# Altium schematic symbol library LATTICEPLDS_Library.SchLib: 291 symbols (part 3 of 32) (continued)
## LC4128ZE-TN100 (continued)
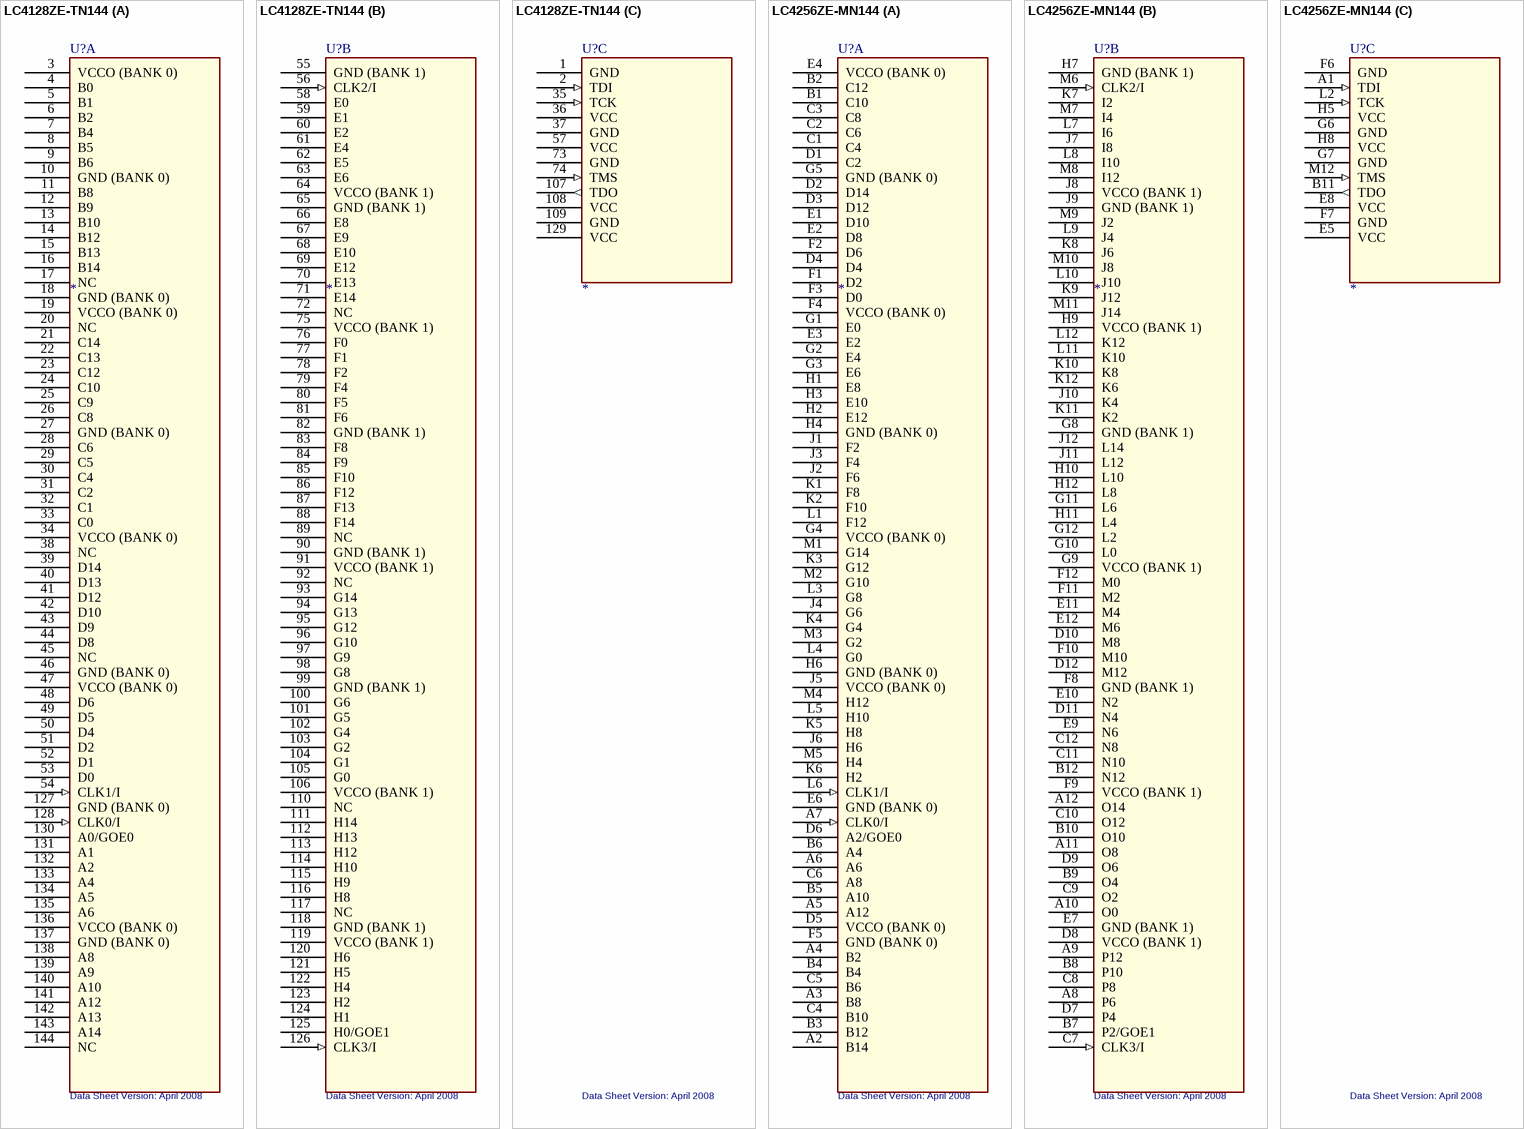
[diagram p26: symbols LC4128ZE-TN144 to LC4256ZE-MN144]

## LC4128ZE-TN144
designator U?  Data Sheet Version: April 2008
SWAP_INFO: (S1+S2+S3); SPLIT_INST: TRUE
part A pins: 3 VCCO (BANK 0) (power), 4 B0, 5 B1, 6 B2, 7 B4, 8 B5, 9 B6, 10 GND (BANK 0) (power), 11 B8, 12 B9, 13 B10, 14 B12, 15 B13, 16 B14, 17 NC, 18 GND (BANK 0) (power), 19 VCCO (BANK 0) (power), 20 NC, 21 C14, 22 C13, 23 C12, 24 C10, 25 C9, 26 C8, 27 GND (BANK 0) (power), 28 C6, 29 C5, 30 C4, 31 C2, 32 C1, 33 C0, 34 VCCO (BANK 0) (power), 38 NC, 39 D14, 40 D13, 41 D12, 42 D10, 43 D9, 44 D8, 45 NC, 46 GND (BANK 0) (power), 47 VCCO (BANK 0) (power), 48 D6, 49 D5, 50 D4, 51 D2, 52 D1, 53 D0, 54 CLK1/I (in), 127 GND (BANK 0) (power), 128 CLK0/I (in), 130 A0/GOE0, 131 A1, 132 A2, 133 A4, 134 A5, 135 A6, 136 VCCO (BANK 0) (power), 137 GND (BANK 0) (power), 138 A8, 139 A9, 140 A10, 141 A12, 142 A13, 143 A14, 144 NC
part B pins: 55 GND (BANK 1) (power), 56 CLK2/I (in), 58 E0, 59 E1, 60 E2, 61 E4, 62 E5, 63 E6, 64 VCCO (BANK 1) (power), 65 GND (BANK 1) (power), 66 E8, 67 E9, 68 E10, 69 E12, 70 E13, 71 E14, 72 NC, 75 VCCO (BANK 1) (power), 76 F0, 77 F1, 78 F2, 79 F4, 80 F5, 81 F6, 82 GND (BANK 1) (power), 83 F8, 84 F9, 85 F10, 86 F12, 87 F13, 88 F14, 89 NC, 90 GND (BANK 1) (power), 91 VCCO (BANK 1) (power), 92 NC, 93 G14, 94 G13, 95 G12, 96 G10, 97 G9, 98 G8, 99 GND (BANK 1) (power), 100 G6, 101 G5, 102 G4, 103 G2, 104 G1, 105 G0, 106 VCCO (BANK 1) (power), 110 NC, 111 H14, 112 H13, 113 H12, 114 H10, 115 H9, 116 H8, 117 NC, 118 GND (BANK 1) (power), 119 VCCO (BANK 1) (power), 120 H6, 121 H5, 122 H4, 123 H2, 124 H1, 125 H0/GOE1, 126 CLK3/I (in)
part C pins: 1 GND (power), 2 TDI (in), 35 TCK (in), 36 VCC (power), 37 GND (power), 57 VCC (power), 73 GND (power), 74 TMS (in), 107 TDO (out), 108 VCC (power), 109 GND (power), 129 VCC (power)

## LC4256ZE-MN144
designator U?  Data Sheet Version: April 2008
SWAP_INFO: (S1+S2+S3); SPLIT_INST: TRUE
part A pins: A2 B14, A3 B8, A4 B2, A5 A12, A6, A7 CLK0/I (in), B1 C10, B2 C12, B3 B12, B4, B5 A10, B6 A4, C1 C4, C2 C6, C3 C8, C4 B10, C5 B6, C6 A8, D1 C2, D2 D14, D3 D12, D4, D5 VCCO (BANK 0) (power), D6 A2/GOE0, E1 D10, E2 D8, E3 E2, E4 VCCO (BANK 0) (power), E6 GND (BANK 0) (power), F1 D2, F2 D6, F3 D0, F4 VCCO (BANK 0) (power), F5 GND (BANK 0) (power), G1 E0, G2 E4, G3 E6, G4 VCCO (BANK 0) (power), G5 GND (BANK 0) (power), H1 E8, H2 E12, H3 E10, H4 GND (BANK 0) (power), H6 GND (BANK 0) (power), J1 F2, J2 F6, J3 F4, J4 G6, J5 VCCO (BANK 0) (power), J6 H6, K1 F8, K2 F10, K3 G12, K4 G4, K5 H8, K6 H2, L1 F12, L3 G8, L4 G0, L5 H10, L6 CLK1/I (in), M1 G14, M2 G10, M3 G2, M4 H12, M5 H4
part B pins: A8 P6, A9 P12, A10 O0, A11 O8, A12 O14, B7 P2/GOE1, B8 P10, B9 O4, B10 O10, B12 N12, C7 CLK3/I (in), C8 P8, C9 O2, C10 O12, C11 N10, C12 N8, D7 P4, D8 VCCO (BANK 1) (power), D9 O6, D10 M8, D11 N4, D12 M12, E7 GND (BANK 1) (power), E9 N6, E10 N2, E11 M4, E12 M6, F8 GND (BANK 1) (power), F9 VCCO (BANK 1) (power), F10 M10, F11 M2, F12 M0, G8 GND (BANK 1) (power), G9 VCCO (BANK 1) (power), G10 L0, G11 L6, G12 L2, H7 GND (BANK 1) (power), H9 VCCO (BANK 1) (power), H10 L10, H11 L4, H12 L8, J7 I8, J8 VCCO (BANK 1) (power), J9 GND (BANK 1) (power), J10 K4, J11 L12, J12 L14, K7 I2, K8 J6, K9 J12, K10 K8, K11 K2, K12 K6, L7 I6, L8 I10, L9 J4, L10 J10, L11 K10, L12 K12, M6 CLK2/I (in), M7 I4, M8 I12, M9 J2, M10 J8, M11 J14
part C pins: A1 TDI (in), B11 TDO (out), E5 VCC (power), E8 VCC (power), F6 GND (power), F7 GND (power), G6 GND (power), G7 GND (power), H5 VCC (power), H8 VCC (power), L2 TCK (in), M12 TMS (in)

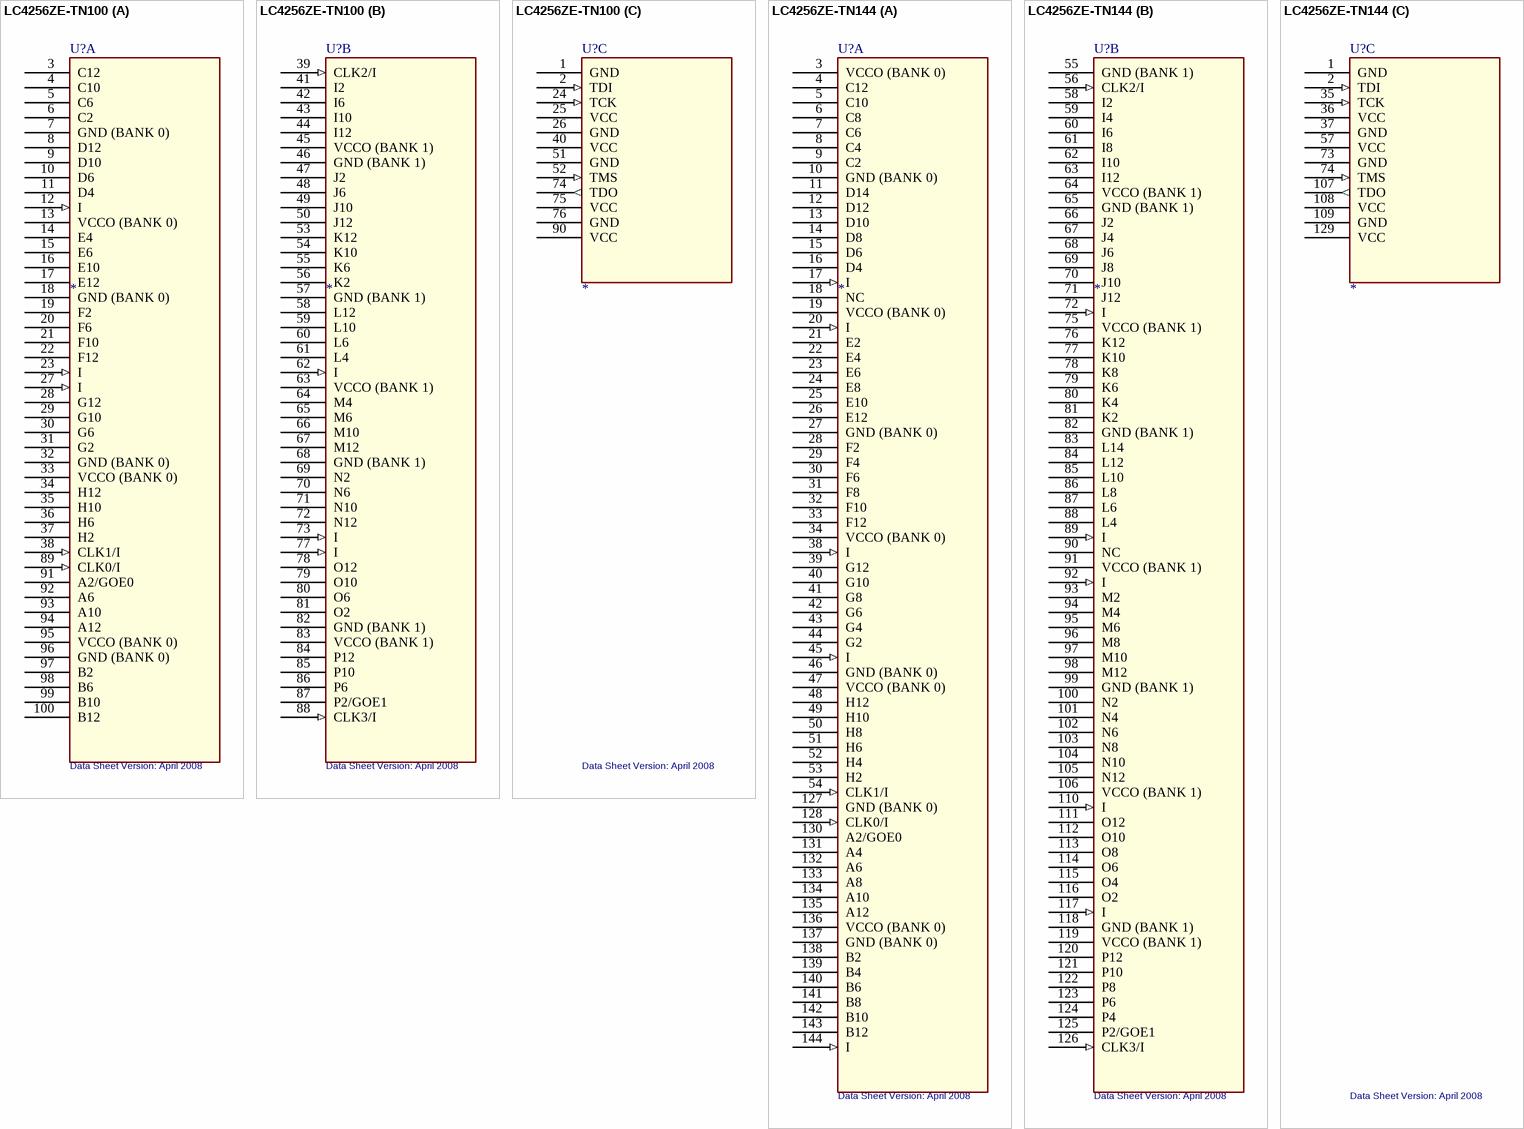
[diagram p27: symbols LC4256ZE-TN100 to LC4256ZE-TN144]

## LC4256ZE-TN100
designator U?  Data Sheet Version: April 2008
SWAP_INFO: (S1+S2+S3); SPLIT_INST: TRUE
part A pins: 3 C12, 4 C10, 5 C6, 6 C2, 7 GND (BANK 0) (power), 8 D12, 9 D10, 10 D6, 11 D4, 12 I (in), 13 VCCO (BANK 0) (power), 14 E4, 15 E6, 16 E10, 17 E12, 18 GND (BANK 0) (power), 19 F2, 20 F6, 21 F10, 22 F12, 23 I (in), 27 I (in), 28 G12, 29 G10, 30 G6, 31 G2, 32 GND (BANK 0) (power), 33 VCCO (BANK 0) (power), 34 H12, 35 H10, 36 H6, 37 H2, 38 CLK1/I (in), 89 CLK0/I (in), 91 A2/GOE0, 92 A6, 93 A10, 94 A12, 95 VCCO (BANK 0) (power), 96 GND (BANK 0) (power), 97 B2, 98 B6, 99 B10, 100 B12
part B pins: 39 CLK2/I (in), 41 I2, 42 I6, 43 I10, 44 I12, 45 VCCO (BANK 1) (power), 46 GND (BANK 1) (power), 47 J2, 48 J6, 49 J10, 50 J12, 53 K12, 54 K10, 55 K6, 56 K2, 57 GND (BANK 1) (power), 58 L12, 59 L10, 60 L6, 61 L4, 62 I (in), 63 VCCO (BANK 1) (power), 64 M4, 65 M6, 66 M10, 67 M12, 68 GND (BANK 1) (power), 69 N2, 70 N6, 71 N10, 72 N12, 73 I (in), 77 I (in), 78 O12, 79 O10, 80 O6, 81 O2, 82 GND (BANK 1) (power), 83 VCCO (BANK 1) (power), 84 P12, 85 P10, 86 P6, 87 P2/GOE1, 88 CLK3/I (in)
part C pins: 1 GND (power), 2 TDI (in), 24 TCK (in), 25 VCC (power), 26 GND (power), 40 VCC (power), 51 GND (power), 52 TMS (in), 74 TDO (out), 75 VCC (power), 76 GND (power), 90 VCC (power)

## LC4256ZE-TN144
designator U?  Data Sheet Version: April 2008
SWAP_INFO: (S1+S2+S3); SPLIT_INST: TRUE
part A pins: 3 VCCO (BANK 0) (power), 4 C12, 5 C10, 6 C8, 7 C6, 8 C4, 9 C2, 10 GND (BANK 0) (power), 11 D14, 12 D12, 13 D10, 14 D8, 15 D6, 16 D4, 17 I (in), 18 NC, 19 VCCO (BANK 0) (power), 20 I (in), 21 E2, 22 E4, 23 E6, 24 E8, 25 E10, 26 E12, 27 GND (BANK 0) (power), 28 F2, 29 F4, 30 F6, 31 F8, 32 F10, 33 F12, 34 VCCO (BANK 0) (power), 38 I (in), 39 G12, 40 G10, 41 G8, 42 G6, 43 G4, 44 G2, 45 I (in), 46 GND (BANK 0) (power), 47 VCCO (BANK 0) (power), 48 H12, 49 H10, 50 H8, 51 H6, 52 H4, 53 H2, 54 CLK1/I (in), 127 GND (BANK 0) (power), 128 CLK0/I (in), 130 A2/GOE0, 131 A4, 132 A6, 133 A8, 134 A10, 135 A12, 136 VCCO (BANK 0) (power), 137 GND (BANK 0) (power), 138 B2, 139 B4, 140 B6, 141 B8, 142 B10, 143 B12, 144 I (in)
part B pins: 55 GND (BANK 1) (power), 56 CLK2/I (in), 58 I2, 59 I4, 60 I6, 61 I8, 62 I10, 63 I12, 64 VCCO (BANK 1) (power), 65 GND (BANK 1) (power), 66 J2, 67 J4, 68 J6, 69 J8, 70 J10, 71 J12, 72 I (in), 75 VCCO (BANK 1) (power), 76 K12, 77 K10, 78 K8, 79 K6, 80 K4, 81 K2, 82 GND (BANK 1) (power), 83 L14, 84 L12, 85 L10, 86 L8, 87 L6, 88 L4, 89 I (in), 90 NC, 91 VCCO (BANK 1) (power), 92 I (in), 93 M2, 94 M4, 95 M6, 96 M8, 97 M10, 98 M12, 99 GND (BANK 1) (power), 100 N2, 101 N4, 102 N6, 103 N8, 104 N10, 105 N12, 106 VCCO (BANK 1) (power), 110 I (in), 111 O12, 112 O10, 113 O8, 114 O6, 115 O4, 116 O2, 117 I (in), 118 GND (BANK 1) (power), 119 VCCO (BANK 1) (power), 120 P12, 121 P10, 122 P8, 123 P6, 124 P4, 125 P2/GOE1, 126 CLK3/I (in)
part C pins: 1 GND (power), 2 TDI (in), 35 TCK (in), 36 VCC (power), 37 GND (power), 57 VCC (power), 73 GND (power), 74 TMS (in), 107 TDO (out), 108 VCC (power), 109 GND (power), 129 VCC (power)

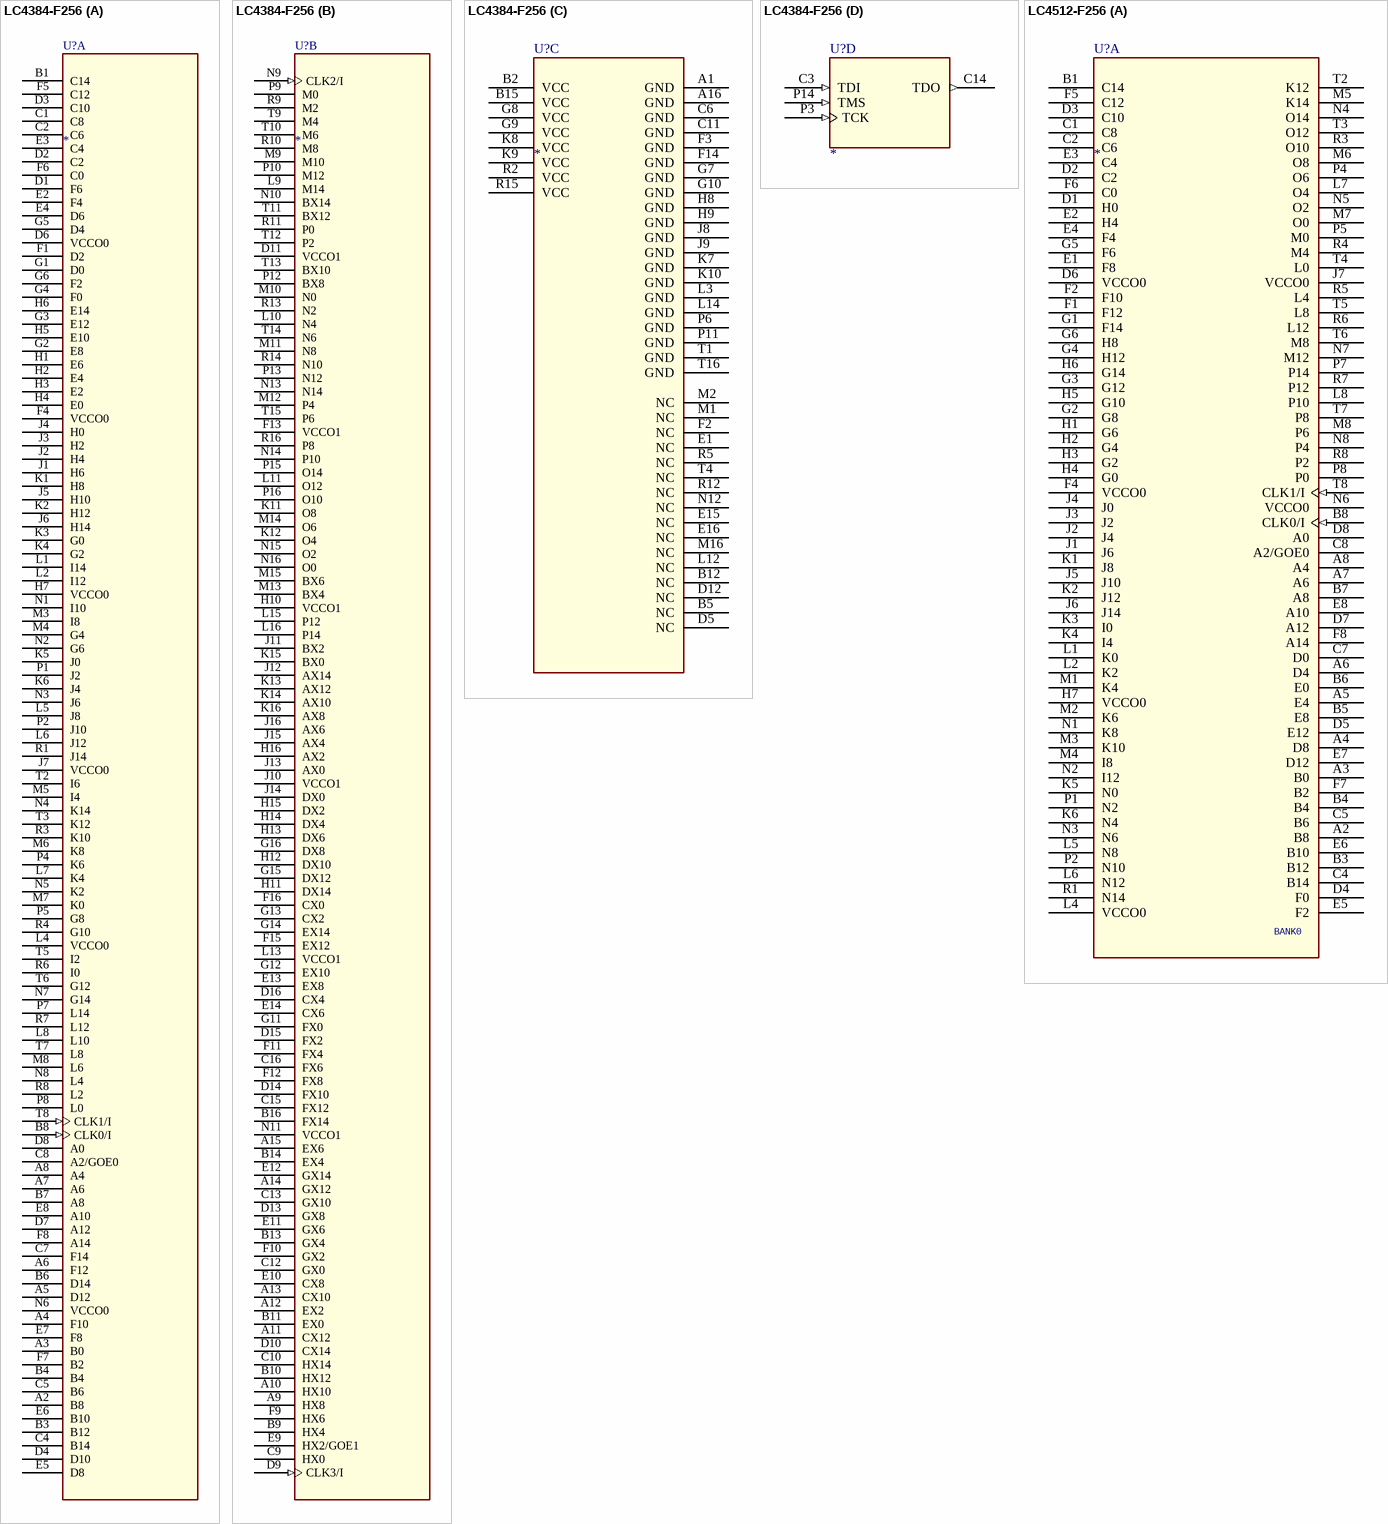
[diagram p28: symbols LC4384-F256 to LC4512-F256]

## LC4384-F256
designator U?
SPLIT_INST: TRUE; SWAP_INFO: (S1+S2+S3)
part A pins: A2 B8, A3 B0, A4 F10, A5 D12, A6 F12, A7 A6, A8 A4, B1 C14, B3 B12, B4, B6 D14, B7 A8, B8 CLK0/I (in), C1 C8, C2 C6, C4 B14, C5 B6, C7 F14, C8 A2/GOE0, D1 F6, D2 C2, D3 C10, D4 D10, D6 VCCO0 (power), D7 A12, D8 A0, E2 F4, E3 C4, E4 D6, E5 D8, E6 B10, E7 F8, E8 A10, F1 D2, F4 VCCO0 (power), F5 C12, F6 C0, F7 B2, F8 A14, G1 D0, G2 E8, G3 E12, G4 F0, G5 D4, G6 F2, H1 E6, H2 E4, H3 E2, H4 E0, H5 E10, H6 E14, H7 VCCO0 (power), J1 H6, J2 H4, J3 H2, J4 H0, J5 H10, J6 H14, J7 VCCO0 (power), K1 H8, K2 H12, K3 G0, K4 G2, K5 J0, K6 J4, L1 I14, L2 I12, L4 VCCO0 (power), L5 J8, L6 J12, L7 K4, L8 L10, M3 I8, M4 G4, M5 I4, M6 K8, M7 K0, M8 L6, N1 I10, N2 G6, N3 J6, N4 K14, N5 K2, N6 VCCO0 (power), N7 G14, N8 L4, P1 J2, P2 J10, P4 K6, P5 G8, P7 L14, P8 L0, R1 J14, R3 K10, R4 G10, R6 I0, R7 L12, R8 L2, T2 I6, T3 K12, T5 I2, T6 G12, T7 L8, T8 CLK1/I (in)
part B pins: A9 HX8, A10 HX10, A11 CX12, A12 EX2, A13 CX10, A14 GX12, A15 EX6, B9 HX4, B10 HX12, B11 EX0, B13 GX4, B14 EX4, B16 FX14, C9 HX0, C10 HX14, C12 GX0, C13 GX10, C15 FX12, C16 FX6, D9 CLK3/I (in), D10 CX14, D11 VCCO1 (power), D13 GX8, D14 FX10, D15 FX2, D16 CX4, E9 HX2/GOE1, E10 CX8, E11 GX6, E12 GX14, E13 EX8, E14 CX6, F9 HX6, F10 GX2, F11 FX4, F12 FX8, F13 VCCO1 (power), F15 EX12, F16 CX0, G11 FX0, G12 EX10, G13 CX2, G14 EX14, G15 DX12, G16 DX8, H10 VCCO1 (power), H11 DX14, H12 DX10, H13 DX6, H14 DX4, H15 DX2, H16 AX2, J10 VCCO1 (power), J11 BX2, J12 AX14, J13 AX0, J14 DX0, J15 AX4, J16 AX6, K11 O8, K12 O4, K13 AX12, K14 AX10, K15 BX0, K16 AX8, L9 M14, L10 N4, L11 O12, L13 VCCO1 (power), L15 P12, L16 P14, M9 M10, M10 N0, M11 N8, M12 P4, M13 BX4, M14 O6, M15 BX6, N9 CLK2/I (in), N10 BX14, N11 VCCO1 (power), N13 N14, N14 P10, N15 O2, N16 O0, P9 M0, P10 M12, P12 BX8, P13 N12, P15 O14, P16 O10, R9 M2, R10 M8, R11 P0, R13 N2, R14 N10, R16 P8, T9 M4, T10 M6, T11 BX12, T12 P2, T13 BX10, T14 N6, T15 P6
part C pins: A1 GND (power), A16 GND (power), B2 VCC (power), B5 NC, B12 NC, B15 VCC (power), C6 GND (power), C11 GND (power), D5 NC, D12 NC, E1 NC, E15 NC, E16 NC, F2 NC, F3 GND (power), F14 GND (power), G7 GND (power), G8 VCC (power), G9 VCC (power), G10 GND (power), H8 GND (power), H9 GND (power), J8 GND, J9 GND (power), K7 GND (power), K8 VCC (power), K9 VCC (power), K10 GND (power), L3 GND (power), L12 NC, L14 GND (power), M1 NC, M2 NC, M16 NC, N12 NC, P6 GND (power), P11 GND (power), R2 VCC (power), R5 NC, R12 NC, R15 VCC (power), T1 GND (power), T4 NC, T16 GND (power)
part D pins: C3 TDI (in), C14 TDO (out), P3 TCK (in), P14 TMS (in)

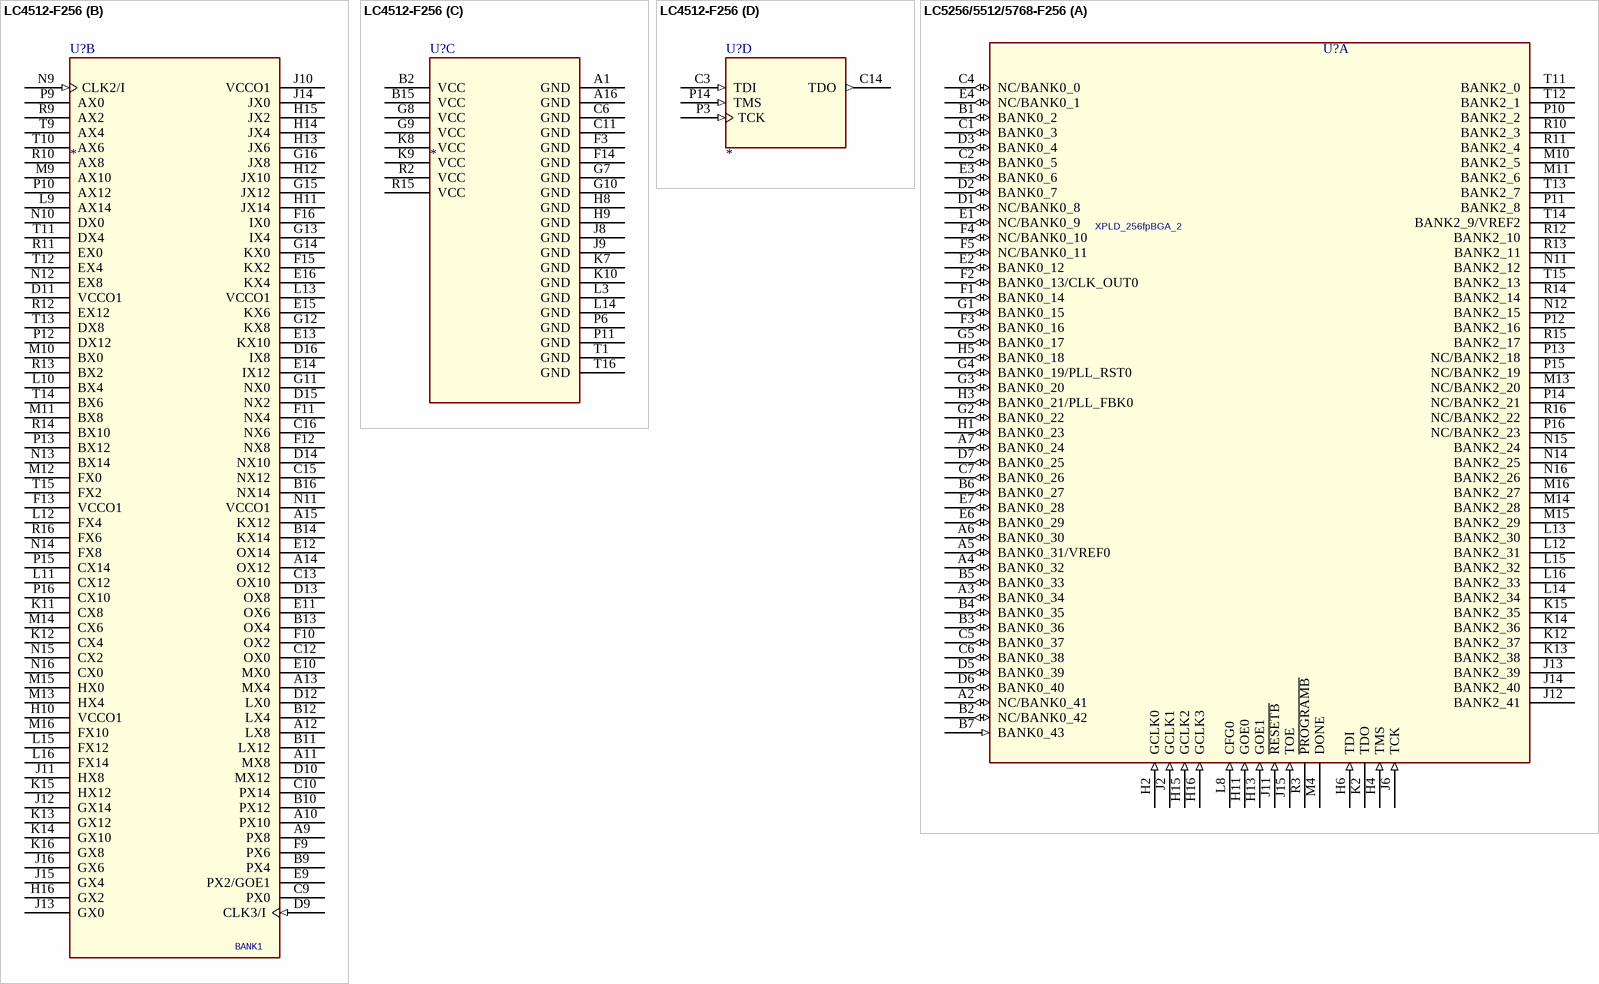
[diagram p29: symbols LC4512-F256 to LC5256/5512/5768-F256]

## LC4512-F256
designator U?
SWAP_INFO: (S1+S2+S3); SPLIT_INST: TRUE
part A pins: A2 B8, A3 B0, A4 D8, A5 E4, A6 D4, A7 A6, A8 A4, B1 C14, B3 B12, B4, B5 E8, B6 E0, B7 A8, B8 CLK0/I (in), C1 C8, C2 C6, C4 B14, C5 B6, C7 D0, C8 A2/GOE0, D1 H0, D2 C2, D3 C10, D4 F0, D5 E12, D6 VCCO0 (power), D7 A12, D8 A0, E1 F8, E2 H4, E3 C4, E4 F4, E5 F2, E6 B10, E7 D12, E8 A10, F1 F12, F2 F10, F4 VCCO0 (power), F5 C12, F6 C0, F7 B2, F8 A14, G1 F14, G2 G8, G3 G12, G4 H12, G5 F6, G6 H8, H1 G6, H2 G4, H3 G2, H4 G0, H5 G10, H6 G14, H7 VCCO0 (power), J1 J6, J2 J4, J3 J2, J4 J0, J5 J10, J6 J14, J7 VCCO0 (power), K1 J8, K2 J12, K3 I0, K4 I4, K5 N0, K6 N4, L1 K0, L2 K2, L4 VCCO0 (power), L5 N8, L6 N12, L7 O4, L8 P10, M1 K4, M2 K6, M3 K10, M4 I8, M5 K14, M6 O8, M7 O0, M8 P6, N1 K8, N2 I12, N3 N6, N4 O14, N5 O2, N6 VCCO0 (power), N7 M12, N8 P4, P1 N2, P2 N10, P4 O6, P5 M0, P7 P14, P8 P0, R1 N14, R3 O10, R4 M4, R5 L4, R6 L12, R7 P12, R8 P2, T2 K12, T3 O12, T4 L0, T5 L8, T6 M8, T7 P8, T8 CLK1/I (in)
part B pins: A9 PX8, A10 PX10, A11 MX8, A12 LX8, A13 MX4, A14 OX12, A15 KX12, B9 PX4, B10 PX12, B11 LX12, B12 LX4, B13 OX4, B14 KX14, B16 NX14, C9 PX0, C10 PX14, C12 OX0, C13 OX10, C15 NX12, C16 NX6, D9 CLK3/I (in), D10 MX12, D11 VCCO1 (power), D12 LX0, D13 OX8, D14 NX10, D15 NX2, D16 IX8, E9 PX2/GOE1, E10 MX0, E11 OX6, E12 OX14, E13 KX10, E14 IX12, E15 KX6, E16 KX4 (power), F9 PX6, F10 OX2, F11 NX4, F12 NX8, F13 VCCO1 (power), F15 KX2, F16 IX0, G11 NX0, G12 KX8, G13 IX4, G14 KX0, G15 JX12, G16 JX8, H10 VCCO1 (power), H11 JX14, H12 JX10, H13 JX6, H14 JX4, H15 JX2, H16 GX2, J10 VCCO1 (power), J11 HX8, J12 GX14, J13 GX0, J14 JX0, J15 GX4, J16 GX6, K11 CX8, K12 CX4, K13 GX12, K14 GX10, K15 HX12, K16 GX8, L9 AX14, L10 BX4, L11 CX12, L12 FX4, L13 VCCO1 (power), L15 FX12, L16 FX14, M9 AX10, M10 BX0, M11 BX8, M12 FX0, M13 HX4, M14 CX6, M15 HX0, M16 FX10, N9 CLK2/I (in), N10 DX0, N11 VCCO1 (power), N12 EX8, N13 BX14, N14 FX8, N15 CX2, N16 CX0, P9 AX0, P10 AX12, P12 DX12, P13 BX12, P15 CX14, P16 CX10, R9 AX2, R10 AX8, R11 EX0, R12 EX12, R13 BX2, R14 BX10, R16 FX6, T9 AX4, T10 AX6, T11 DX4, T12 EX4, T13 DX8, T14 BX6, T15 FX2
part C pins: A1 GND (power), A16 GND (power), B2 VCC (power), B15 VCC (power), C6 GND (power), C11 GND (power), F3 GND (power), F14 GND (power), G7 GND (power), G8 VCC (power), G9 VCC (power), G10 GND (power), H8 GND (power), H9 GND (power), J8 GND, J9 GND (power), K7 GND (power), K8 VCC (power), K9 VCC (power), K10 GND (power), L3 GND (power), L14 GND (power), P6 GND (power), P11 GND (power), R2 VCC (power), R15 VCC (power), T1 GND (power), T16 GND (power)
part D pins: C3 TDI (in), C14 TDO (out), P3 TCK (in), P14 TMS (in)
part A text: BANK0
part B text: BANK1

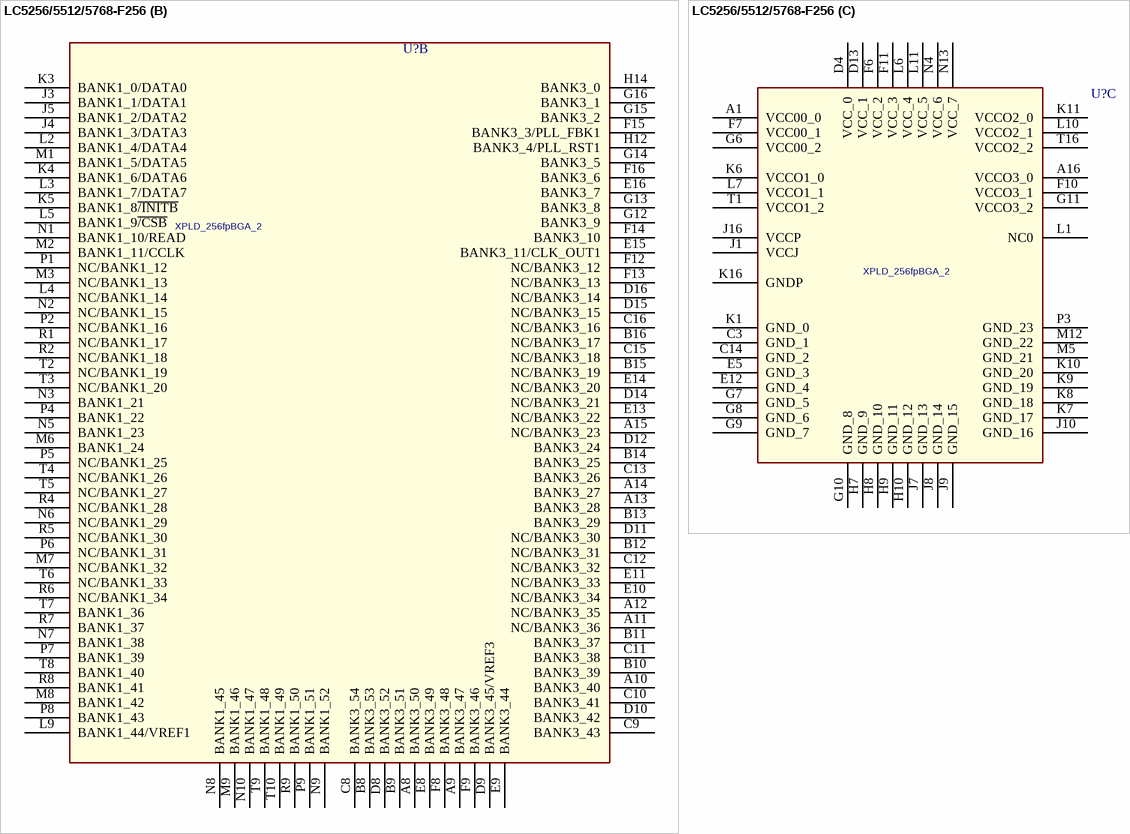
[diagram p30: symbol LC5256/5512/5768-F256]

## LC5256/5512/5768-F256
designator U?, comment XPLD_256fpBGA_2
part A pins: A2 NC/BANK0_41 (io), A3 BANK0_34 (io), A4 BANK0_32 (io), A5 BANK0_31/VREF0 (io), A6 BANK0_30 (io), A7 BANK0_24 (io), B1 BANK0_2 (io), B2 NC/BANK0_42 (io), B3 BANK0_36 (io), B4 BANK0_35 (io), B5 BANK0_33 (io), B6 BANK0_27 (io), B7 BANK0_43 (in), C1 BANK0_3 (io), C2 BANK0_5 (io), C4 NC/BANK0_0 (io), C5 BANK0_37 (io), C6 BANK0_38 (io), C7 BANK0_26 (io), D1 NC/BANK0_8 (io), D2 BANK0_7 (io), D3 BANK0_4 (io), D5 BANK0_39 (io), D6 BANK0_40 (io), D7 BANK0_25 (io), E1 NC/BANK0_9 (io), E2 BANK0_12 (io), E3 BANK0_6 (io), E4 NC/BANK0_1 (io), E6 BANK0_29 (io), E7 BANK0_28 (io), F1 BANK0_14 (io), F2 BANK0_13/CLK_OUT0 (io), F3 BANK0_16 (io), F4 NC/BANK0_10 (io), F5 NC/BANK0_11 (io), G1 BANK0_15 (io), G2 BANK0_22 (io), G3 BANK0_20 (io), G4 BANK0_19/PLL_RST0 (io), G5 BANK0_17 (io), H1 BANK0_23 (io), H2 GCLK0 (in), H3 BANK0_21/PLL_FBK0 (io), H4 TMS (in), H5 BANK0_18 (io), H6 TDI (in), H11 GOE0 (in), H13 GOE1 (in), H15 GCLK2 (in), H16 GCLK3 (in), J2 GCLK1 (in), J6 TCK (in), J11 ~{RESETB} (in), J12 BANK2_41 (hiz), J13 BANK2_39 (hiz), J14 BANK2_40 (hiz), J15 TOE (in), K2 TDO (hiz), K12 BANK2_37 (hiz), K13 BANK2_38 (hiz), K14 BANK2_36 (hiz), K15 BANK2_35 (hiz), L8 CFG0 (in), L12 BANK2_31 (hiz), L13 BANK2_30 (hiz), L14 BANK2_34 (hiz), L15 BANK2_32 (hiz), L16 BANK2_33 (hiz), M4 DONE (oc), M10 BANK2_5 (hiz), M11 BANK2_6 (hiz), M13 NC/BANK2_20 (hiz), M14 BANK2_28 (hiz), M15 BANK2_29 (hiz), M16 BANK2_27 (hiz), N11 BANK2_12 (hiz), N12 BANK2_15 (hiz), N14 BANK2_25 (hiz), N15 BANK2_24 (hiz), N16 BANK2_26 (hiz), P10 BANK2_2 (hiz), P11 BANK2_8 (hiz), P12 BANK2_16 (hiz), P13 NC/BANK2_18 (hiz), P14 NC/BANK2_21 (hiz), P15 NC/BANK2_19 (hiz), P16 NC/BANK2_23 (hiz), R3 ~{PROGRAMB} (oc), R10 BANK2_3 (hiz), R11 BANK2_4 (hiz), R12 BANK2_10 (hiz), R13 BANK2_11 (hiz), R14 BANK2_14 (hiz), R15 BANK2_17 (hiz), R16 NC/BANK2_22 (hiz), T11 BANK2_0 (hiz), T12 BANK2_1 (hiz), T13 BANK2_7 (hiz), T14 BANK2_9/VREF2 (hiz), T15 BANK2_13 (hiz)
part B pins: A8 BANK3_50 (hiz), A9 BANK3_47 (hiz), A10 BANK3_40 (hiz), A11 NC/BANK3_36 (hiz), A12 NC/BANK3_35 (hiz), A13 BANK3_28 (hiz), A14 BANK3_27 (hiz), A15 NC/BANK3_23 (hiz), B8 BANK3_53 (hiz), B9 BANK3_51 (hiz), B10 BANK3_39 (hiz), B11 BANK3_37 (hiz), B12 NC/BANK3_31 (hiz), B13 BANK3_29 (hiz), B14 BANK3_25 (hiz), B15 NC/BANK3_19 (hiz), B16 NC/BANK3_17 (hiz), C8 BANK3_54 (hiz), C9 BANK3_43 (hiz), C10 BANK3_41 (hiz), C11 BANK3_38 (hiz), C12 NC/BANK3_32 (hiz), C13 BANK3_26 (hiz), C15 NC/BANK3_18 (hiz), C16 NC/BANK3_16 (hiz), D8 BANK3_52 (hiz), D9 BANK3_45/VREF3 (hiz), D10 BANK3_42 (hiz), D11 NC/BANK3_30 (hiz), D12 BANK3_24 (hiz), D14 NC/BANK3_21 (hiz), D15 NC/BANK3_15 (hiz), D16 NC/BANK3_14 (hiz), E8 BANK3_49 (hiz), E9 BANK3_44 (hiz), E10 NC/BANK3_34 (hiz), E11 NC/BANK3_33 (hiz), E13 NC/BANK3_22 (hiz), E14 NC/BANK3_20 (hiz), E15 BANK3_11/CLK_OUT1 (hiz), E16 BANK3_7 (hiz), F8 BANK3_48 (hiz), F9 BANK3_46 (hiz), F12 NC/BANK3_12 (hiz), F13 NC/BANK3_13 (hiz), F14 BANK3_10 (hiz), F15 BANK3_3/PLL_FBK1 (hiz), F16 BANK3_6 (hiz), G12 BANK3_9 (hiz), G13 BANK3_8 (hiz), G14 BANK3_5 (hiz), G15 BANK3_2 (hiz), G16 BANK3_1 (hiz), H12 BANK3_4/PLL_RST1 (hiz), H14 BANK3_0 (hiz), J3 BANK1_1/DATA1 (hiz), J4 BANK1_3/DATA3 (hiz), J5 BANK1_2/DATA2 (hiz), K3 BANK1_0/DATA0 (hiz), K4 BANK1_6/DATA6 (hiz), K5 BANK1_8~{/INITB} (hiz), L2 BANK1_4/DATA4 (hiz), L3 BANK1_7/DATA7 (hiz), L4 NC/BANK1_14 (hiz), L5 BANK1_9~{/CSB} (hiz), L9 BANK1_44/VREF1 (hiz), M1 BANK1_5/DATA5 (hiz), M2 BANK1_11/CCLK (hiz), M3 NC/BANK1_13 (hiz), M6 BANK1_24 (hiz), M7 NC/BANK1_32 (hiz), M8 BANK1_42 (hiz), M9 BANK1_46 (hiz), N1 BANK1_10/READ (hiz), N2 NC/BANK1_15 (hiz), N3 BANK1_21 (hiz), N5 BANK1_23 (hiz), N6 NC/BANK1_29 (hiz), N7 BANK1_38 (hiz), N8 BANK1_45 (hiz), N9 BANK1_52 (hiz), N10 BANK1_47 (hiz), P1 NC/BANK1_12 (hiz), P2 NC/BANK1_16 (hiz), P4 BANK1_22 (hiz), P5 NC/BANK1_25 (hiz), P6 NC/BANK1_31 (hiz), P7 BANK1_39 (hiz), P8 BANK1_43 (hiz), P9 BANK1_51 (hiz), R1 NC/BANK1_17 (hiz), R2 NC/BANK1_18 (hiz), R4 NC/BANK1_28 (hiz), R5 NC/BANK1_30 (hiz), R6 NC/BANK1_34 (hiz), R7 BANK1_37 (hiz), R8 BANK1_41 (hiz), R9 BANK1_50 (hiz), T2 NC/BANK1_19 (hiz), T3 NC/BANK1_20 (hiz), T4 NC/BANK1_26 (hiz), T5 NC/BANK1_27 (hiz), T6 NC/BANK1_33 (hiz), T7 BANK1_36 (hiz), T8 BANK1_40 (hiz), T9 BANK1_48 (hiz), T10 BANK1_49 (hiz)
part C pins: A1 VCC00_0 (power), A16 VCCO3_0 (power), C3 GND_1 (power), C14 GND_2 (power), D4 VCC_0 (power), D13 VCC_1 (power), E5 GND_3 (power), E12 GND_4 (power), F6 VCC_2 (power), F7 VCC00_1 (power), F10 VCCO3_1 (power), F11 VCC_3 (power), G6 VCC00_2 (power), G7 GND_5 (power), G8 GND_6 (power), G9 GND_7 (power), G10 GND_8 (power), G11 VCCO3_2 (power), H7 GND_9 (power), H8 GND_10 (power), H9 GND_11 (power), H10 GND_12 (power), J1 VCCJ (power), J7 GND_13 (power), J8 GND_14 (power), J9 GND_15 (power), J10 GND_16 (power), J16 VCCP (power), K1 GND_0 (power), K6 VCCO1_0 (power), K7 GND_17 (power), K8 GND_18 (power), K9 GND_19 (power), K10 GND_20 (power), K11 VCCO2_0 (power), K16 GNDP (power), L1 NC0 (power), L6 VCC_4 (power), L7 VCCO1_1 (power), L10 VCCO2_1 (power), L11 VCC_5 (power), M5 GND_21 (power), M12 GND_22 (power), N4 VCC_6 (power), N13 VCC_7 (power), P3 GND_23 (power), T1 VCCO1_2 (power), T16 VCCO2_2 (power)